# Altium footprint library Hare_Library.PcbLib: 252 footprints (part 15 of 16)
Each footprint in its own frame and in the unit in brackets; x right, y up, seen from the top. Pads: shape width x height; smd on the part's side, far side on the other; paste and mask are expansions set on the pad; w line width, h text height; cw(c..) or ccw(c..) is an arc to the next point about the centre after c.
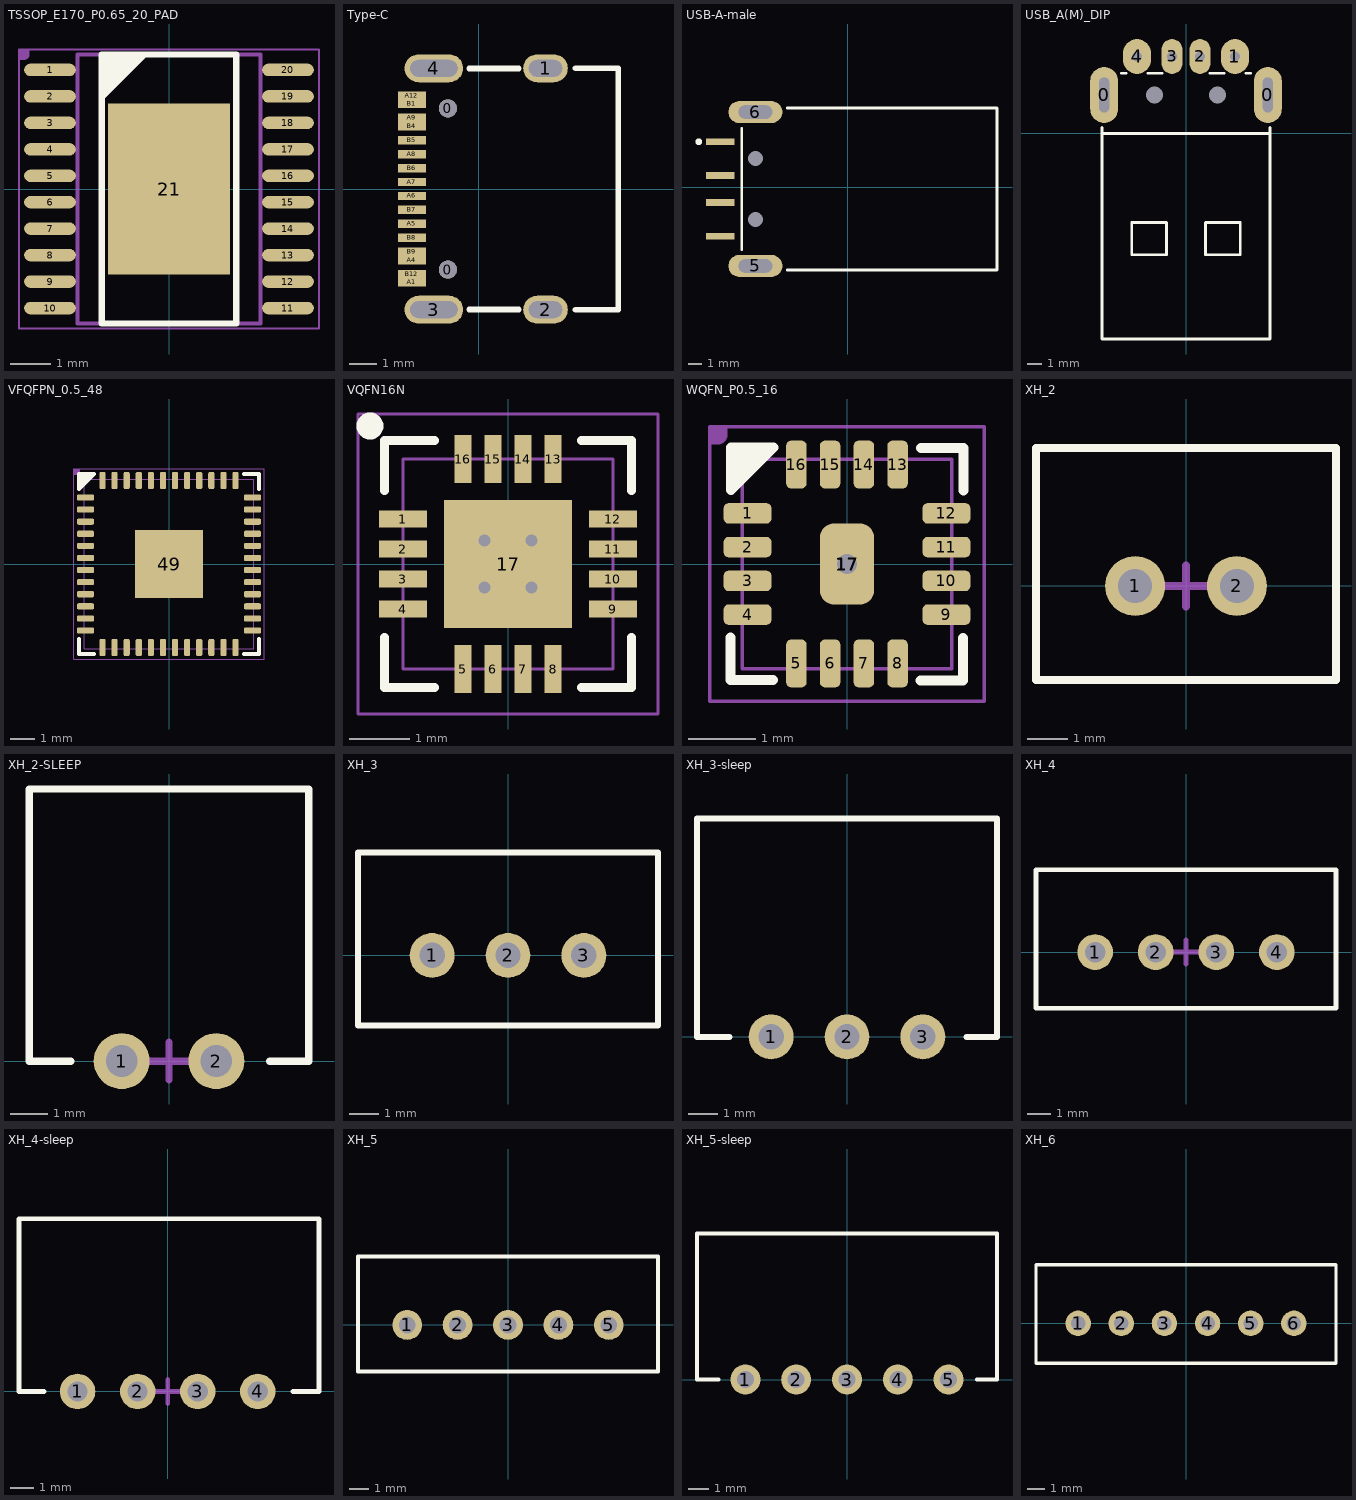
[diagram p14: the footprints below, top view; thin cyan lines are the x and y axes]

## TSSOP_E170_P0.65_20_PAD [mil]
height 47.24
pads (21):
  oval 50x12 smd: 1(-115,115.16) 2(-115,89.57) 3(-115,63.98) 4(-115,38.39) 5(-115,12.8) 6(-115,-12.8) 7(-115,-38.39) 8(-115,-63.98) 9(-115,-89.57) 10(-115,-115.16) 11(115,-115.16) 12(115,-89.57) 13(115,-63.98) 14(115,-38.39) 15(115,-12.8) 16(115,12.8) 17(115,38.39) 18(115,63.98) 19(115,89.57) 20(115,115.16)
  rect 118.11x165.35 smd: 21(0,0)
Top Overlay:
  region: -65,130 -20,130 -65,85
  lines w6: -65,-130 65,-130 65,130 -65,130 -65,-130
Mechanical 13:
  lines w2: -10,0 10,0 ; 0,-10 0,10
  lines w3.94: -88.58,-129.92 88.58,-129.92 88.58,129.92 -88.58,129.92 -88.58,-129.92
Mechanical 14:
  region: -145,135 -135,135 -135,130 -135,129.01 -135.76,127.17 -137.17,125.76 -139.01,125 -140,125 -145,125
  lines w2: -145,-135 -145,135 145,135 145,-135 -145,-135
3D body "User Library-TSSOP-20 6_6x4_4.STEP": height 41.69, standoff -1.62, extent -125.98,-129.91 125.99,129.93

## Type-C [mm]
pads (22):
  round 0.65 hole 0.65: 0(-1.105,-2.89) 0(-1.105,2.89)
  oval 1.6x1 hole 0.6 slot 1.2 at 0 deg: 1(2.395,4.325) 2(2.395,-4.325)
  oval 2.1x1 hole 0.6 slot 1.7 at 0 deg: 3(-1.605,-4.325) 4(-1.605,4.325)
  rect 1x0.3 smd: A1(-2.395,-3.35) A4(-2.395,-2.55) A5(-2.395,-1.25) A6(-2.395,-0.25) A7(-2.395,0.25) A8(-2.395,1.25) A9(-2.395,2.55) A12(-2.395,3.35) B1(-2.395,3.05) B4(-2.395,2.25) B5(-2.395,1.75) B6(-2.395,0.75) B7(-2.395,-0.75) B8(-2.395,-1.75) B9(-2.395,-2.25) B12(-2.395,-3.05)
Top Overlay:
  lines w0.203: -0.343,-4.318 1.435,-4.318 ; -0.343,4.318 1.435,4.318 ; 3.467,-4.325 4.995,-4.325 4.995,4.325 3.467,4.325

## USB-A-male [mm]
pads (8):
  rect 2.1x0.5 smd: 1(-9.453,3.354) 2(-9.453,0.854) 3(-9.453,-1.146) 4(-9.453,-3.646)
  oval 4x1.65 hole 1 slot 2.5 at 0 deg: 5(-6.853,-5.846) 6(-6.853,5.554)
  round 0.8 hole 1.1 unplated: MH1(-6.853,-2.396) MH2(-6.853,2.104)
Top Overlay:
  circle w0.25: c-11.053,3.354 r0.125
  lines w0.2: -7.853,-4.621 -7.853,4.329 ; -4.483,-6.146 11.047,-6.146 11.047,5.854 -4.483,5.854
3D body "User Library-USB-Male Port.SLDPRT": height 1.75, standoff -3.01, extent -7.772,-6.156 10.56,5.852

## USB_A(M)_DIP [mm]
pads (8):
  oval 2x4 hole 0.7 slot 2.5 at 90 deg: 0(-5.85,2.75) 0(5.85,2.75)
  round 0.2 hole 1.2: 0(-2.25,2.75) 0(2.25,2.75)
  oval 2x2.5 hole 0.7: 1(3.5,5.5) 4(-3.5,5.5)
  oval 1.5x2.5 hole 0.7: 2(1,5.5) 3(-1,5.5)
Top Overlay:
  lines w0.2: -6,0 6,0 ; -6,0.425 -6,-14.7 6,-14.7 6,0.425 ; -4.625,4.3 -4.275,4.3 ; -2.725,4.3 -1.7,4.3 ; 1.7,4.3 2.725,4.3 ; 4.275,4.3 4.625,4.3 ; -3.875,-8.675 -3.875,-6.375 -1.4,-6.375 -1.4,-8.675 -3.875,-8.675 ; 1.4,-8.675 1.4,-6.375 3.875,-6.375 3.875,-8.675 1.4,-8.675

## VFQFPN_0.5_48 [mil]
height 21.65
pads (49):
  rrect50% 28x10 smd: 1(-136,108.27) 2(-136,88.58) 3(-136,68.9) 4(-136,49.21) 5(-136,29.53) 6(-136,9.84) 7(-136,-9.84) 8(-136,-29.53) 9(-136,-49.21) 10(-136,-68.9) 11(-136,-88.58) 12(-136,-108.27) 25(136,-108.27) 26(136,-88.58) 27(136,-68.9) 28(136,-49.21) 29(136,-29.53) 30(136,-9.84) 31(136,9.84) 32(136,29.53) 33(136,49.21) 34(136,68.9) 35(136,88.58) 36(136,108.27)
  rrect50% 10x28 smd: 13(-108.27,-136) 14(-88.58,-136) 15(-68.9,-136) 16(-49.21,-136) 17(-29.53,-136) 18(-9.84,-136) 19(9.84,-136) 20(29.53,-136) 21(49.21,-136) 22(68.9,-136) 23(88.58,-136) 24(108.27,-136) 37(108.27,136) 38(88.58,136) 39(68.9,136) 40(49.21,136) 41(29.53,136) 42(9.84,136) 43(-9.84,136) 44(-29.53,136) 45(-49.21,136) 46(-68.9,136) 47(-88.58,136) 48(-108.27,136)
  rect 110.24x110.24 smd: 49(0,0)
Top Overlay:
  region: -146.67,146.67 -122,146.67 -146.67,122
  lines w6: -146.67,-122 -146.67,-146.67 -122,-146.67 ; 122,-146.67 146.67,-146.67 146.67,-122 ; 122,146.67 146.67,146.67 146.67,122 ; -146.67,122 -122,146.67 -146.67,146.67 -146.67,122
Top Solder:
  rectangle: -150,-108.27 -122,108.27
  region: 108.27,-150 108.27,-122 -108.27,-122 -108.27,-150
  region: 150,108.27 122,108.27 122,-108.27 150,-108.27
  region: -108.27,150 -108.27,122 108.27,122 108.27,150
Mechanical 13:
  lines w2: -10,0 10,0 ; 0,-10 0,10 ; -137.79,-137.8 -137.79,137.8 137.8,137.8 137.8,-137.8 -137.79,-137.8
Mechanical 14:
  region: -155,155 -145,155 -145,150 -145,149.01 -145.76,147.17 -147.17,145.76 -149.01,145 -150,145 -155,145
  lines w2: -155,-155 155,-155 155,155 -155,155 -155,-155
3D body "QFN50P700X700X55-48L.step": height 21.65, standoff 0, extent -138.58,-138.58 138.58,138.59

## VQFN16N [mm]
pads (17):
  rect 0.8x0.28 smd: 1(-1.75,0.75) 2(-1.75,0.25) 3(-1.75,-0.25) 4(-1.75,-0.75) 9(1.75,-0.75) 10(1.75,-0.25) 11(1.75,0.25) 12(1.75,0.75)
  rect 0.28x0.8 smd: 5(-0.75,-1.75) 6(-0.25,-1.75) 7(0.25,-1.75) 8(0.75,-1.75) 13(0.75,1.75) 14(0.25,1.75) 15(-0.25,1.75) 16(-0.75,1.75)
  rect 2.14x2.14 smd: 17(0,0)
via 0.394,-0.394 diameter 0.5 hole 0.2
via -0.394,-0.394 diameter 0.5 hole 0.2
via -0.394,0.394 diameter 0.5 hole 0.2
via 0.394,0.394 diameter 0.5 hole 0.2
Top Overlay:
  circle w0.25: c-2.3,2.3 r0.1
  lines w0.152: -2.057,-1.223 -2.057,-2.057 -1.223,-2.057 ; -2.057,1.223 -2.057,2.057 -1.223,2.057 ; 1.223,-2.057 2.057,-2.057 2.057,-1.223 ; 1.223,2.057 2.057,2.057 2.057,1.223
Mechanical 13:
  lines w0.051: -0.127,0 0.127,0 ; 0,-0.127 0,0.127 ; -1.75,-1.75 1.75,-1.75 1.75,1.75 -1.75,1.75 -1.75,-1.75
Mechanical 14:
  lines w0.051: -2.5,-2.5 2.5,-2.5 2.5,2.5 -2.5,2.5 -2.5,-2.5
3D body "RVA0016A.stp": height 1, standoff 0, extent -1.75,-1.75 1.75,1.75

## WQFN_P0.5_16 [mil]
height 23.62
pads (18):
  rrect50% 28x12 smd: 1(-58,29.53) 2(-58,9.84) 3(-58,-9.84) 4(-58,-29.53) 9(58,-29.53) 10(58,-9.84) 11(58,9.84) 12(58,29.53)
  rrect50% 12x28 smd: 5(-29.53,-58) 6(-9.84,-58) 7(9.84,-58) 8(29.53,-58) 13(29.53,58) 14(9.84,58) 15(-9.84,58) 16(-29.53,58)
  rrect50% 31.5x47.24 smd: 17(0,0)
  round 15.75 hole 11.81: 17(0,0)
Top Overlay:
  region: -67.67,68 -43,68 -67.67,43.33
  lines w6: -68,-43 -68,-67.67 -43.33,-67.67 ; 43,-68 67.67,-68 67.67,-43.33 ; 43.33,67.67 68,67.67 68,43 ; -67.67,43.33 -67.67,68 -43,68 -67.67,43.33
Top Solder:
  rectangle: -72,-29.53 -44,29.53
  region: 29.53,-72 29.53,-44 -29.53,-44 -29.53,-72
  region: -29.53,72 -29.53,44 29.53,44 29.53,72
  region: 72,29.53 44,29.53 44,-29.53 72,-29.53
Mechanical 13:
  lines w2: -10,0 10,0 ; 0,-10 0,10 ; -61.02,-61.02 61.02,-61.02 61.02,61.02 -61.02,61.02 -61.02,-61.02
Mechanical 14:
  region: -80,80 -70,80 -70,75 -70,74.01 -70.76,72.17 -72.17,70.76 -74.01,70 -75,70 -80,70
  lines w2: -80,-80 -80,80 80,80 80,-80 -80,-80
3D body "QFN50P300X300X100-16N.step": height 39.37, standoff 0, extent -59.05,-59.05 59.06,59.06

## XH_2 [mm]
pads (2):
  round 1.5 hole 0.85: 1(-1.27,0) 2(1.27,0)
Top Overlay:
  lines w0.2: -3.75,-2.35 3.75,-2.35 3.75,3.45 -3.75,3.45 -3.75,-2.35
Mechanical 15:
  lines w0.2: -0.508,0 0.508,0 ; 0,-0.508 0,0.508
3D body "XH_2.STEP": height 7.21, standoff -3.19, extent -3.75,-2.35 3.75,3.45

## XH_2-SLEEP [mm]
pads (2):
  round 1.5 hole 0.85: 1(-1.27,0) 2(1.27,0)
Top Overlay:
  lines w0.2: -3.75,0 -3.75,7.3 3.75,7.3 3.75,0 ; -3.7,0 -2.63,0 ; 2.7,0 3.7,0
Mechanical 15:
  lines w0.2: -0.508,0 0.508,0 ; 0,-0.508 0,0.508
3D body "JST-XH-2.5mm-2P.STEP": height 5.95, standoff -3.35, extent -3.75,-0.34 3.75,7.3

## XH_3 [mm]
pads (3):
  round 1.5 hole 0.85: 1(-2.54,0) 2(0,0) 3(2.54,0)
Top Overlay:
  lines w0.2: -5.02,-2.35 -5.02,3.45 5.02,3.45 5.02,-2.35 -5.02,-2.35
3D body "XH_3.STEP": height 7.21, standoff -3.19, extent -5.02,-2.35 5.02,3.45

## XH_3-sleep [mm]
pads (3):
  round 1.5 hole 0.85: 1(-2.54,0) 2(0,0) 3(2.54,0)
Top Overlay:
  lines w0.2: -5.02,0 -5.02,7.3 5.02,7.3 5.02,0 ; -5,0 -3.93,0 ; 4,0 5,0
3D body "JST-XH-2.5mm-3P.STEP": height 5.95, standoff -3.35, extent -5,-0.34 5,7.3

## XH_4 [mm]
pads (4):
  round 1.5 hole 0.85: 1(-3.81,0) 2(-1.27,0) 3(1.27,0) 4(3.81,0)
Top Overlay:
  lines w0.2: -6.29,-2.35 -6.29,3.45 6.29,3.45 6.29,-2.35 -6.29,-2.35
Mechanical 15:
  lines w0.2: -0.508,0 0.508,0 ; 0,-0.508 0,0.508
3D body "XH(left).STEP": height 7.2, standoff -3.2, extent -6.29,-2.35 -2.54,3.45
3D body "XH(right).STEP": height 7.2, standoff -3.2, extent 2.54,-2.35 6.29,3.45
3D body "XH(middle).STEP": height 7.2, standoff -3.2, extent -2.54,-2.35 0,3.45
3D body "XH(middle).STEP": height 7.2, standoff -3.2, extent 0,-2.35 2.54,3.45

## XH_4-sleep [mm]
pads (4):
  round 1.5 hole 0.85: 1(-3.81,0) 2(-1.27,0) 3(1.27,0) 4(3.81,0)
Top Overlay:
  lines w0.2: -5.23,0 -6.29,0 -6.29,7.3 6.4,7.3 6.4,0 5.3,0
Mechanical 15:
  lines w0.2: -0.508,0 0.508,0 ; 0,-0.508 0,0.508
3D body: height 5.8, standoff 0, extent -6.3,0 6.3,7.3

## XH_5 [mm]
pads (5):
  round 1.5 hole 0.85: 1(-5.08,0) 2(-2.54,0) 3(0,0) 4(2.54,0) 5(5.08,0)
Top Overlay:
  lines w0.2: -7.56,-2.35 7.56,-2.35 7.56,3.45 -7.56,3.45 -7.56,-2.35
3D body "XH(middle).STEP": height 7.2, standoff -3.2, extent 1.27,-2.35 3.81,3.45
3D body "XH(middle).STEP": height 7.2, standoff -3.2, extent -1.27,-2.35 1.27,3.45
3D body "XH(middle).STEP": height 7.2, standoff -3.2, extent -3.81,-2.35 -1.27,3.45
3D body "XH(right).STEP": height 7.2, standoff -3.2, extent 3.81,-2.35 7.56,3.45
3D body "XH(left).STEP": height 7.2, standoff -3.2, extent -7.56,-2.35 -3.81,3.45

## XH_5-sleep [mm]
pads (5):
  round 1.5 hole 0.85: 1(-5.08,0) 2(-2.54,0) 3(0,0) 4(2.54,0) 5(5.08,0)
Top Overlay:
  lines w0.2: -6.43,0 -7.5,0 -7.5,7.3 7.5,7.3 7.5,0 6.5,0
3D body: height 5.8, standoff 0, extent -7.5,0 7.5,7.3

## XH_6 [mm]
pads (6):
  round 1.5 hole 0.85: 1(-6.35,0) 2(-3.81,0) 3(-1.27,0) 4(1.27,0) 5(3.81,0) 6(6.35,0)
Top Overlay:
  lines w0.2: -8.83,-2.35 -8.83,3.45 8.83,3.45 8.83,-2.35 -8.83,-2.35
3D body "XH(middle).STEP": height 7.2, standoff -3.2, extent 0,-2.35 2.54,3.45
3D body "XH(left).STEP": height 7.2, standoff -3.2, extent -8.83,-2.35 -5.08,3.45
3D body "XH(right).STEP": height 7.2, standoff -3.2, extent 5.08,-2.35 8.83,3.45
3D body "XH(middle).STEP": height 7.2, standoff -3.2, extent -5.08,-2.35 -2.54,3.45
3D body "XH(middle).STEP": height 7.2, standoff -3.2, extent -2.54,-2.35 0,3.45
3D body "XH(middle).STEP": height 7.2, standoff -3.2, extent 2.54,-2.35 5.08,3.45